# Altium footprint library self_pcblib v1.8.6.PcbLib: 123 footprints (part 2 of 8)
Each footprint in its own frame and in the unit in brackets; x right, y up, seen from the top. Pads: shape width x height; smd on the part's side, far side on the other; paste and mask are expansions set on the pad; w line width, h text height; cw(c..) or ccw(c..) is an arc to the next point about the centre after c.
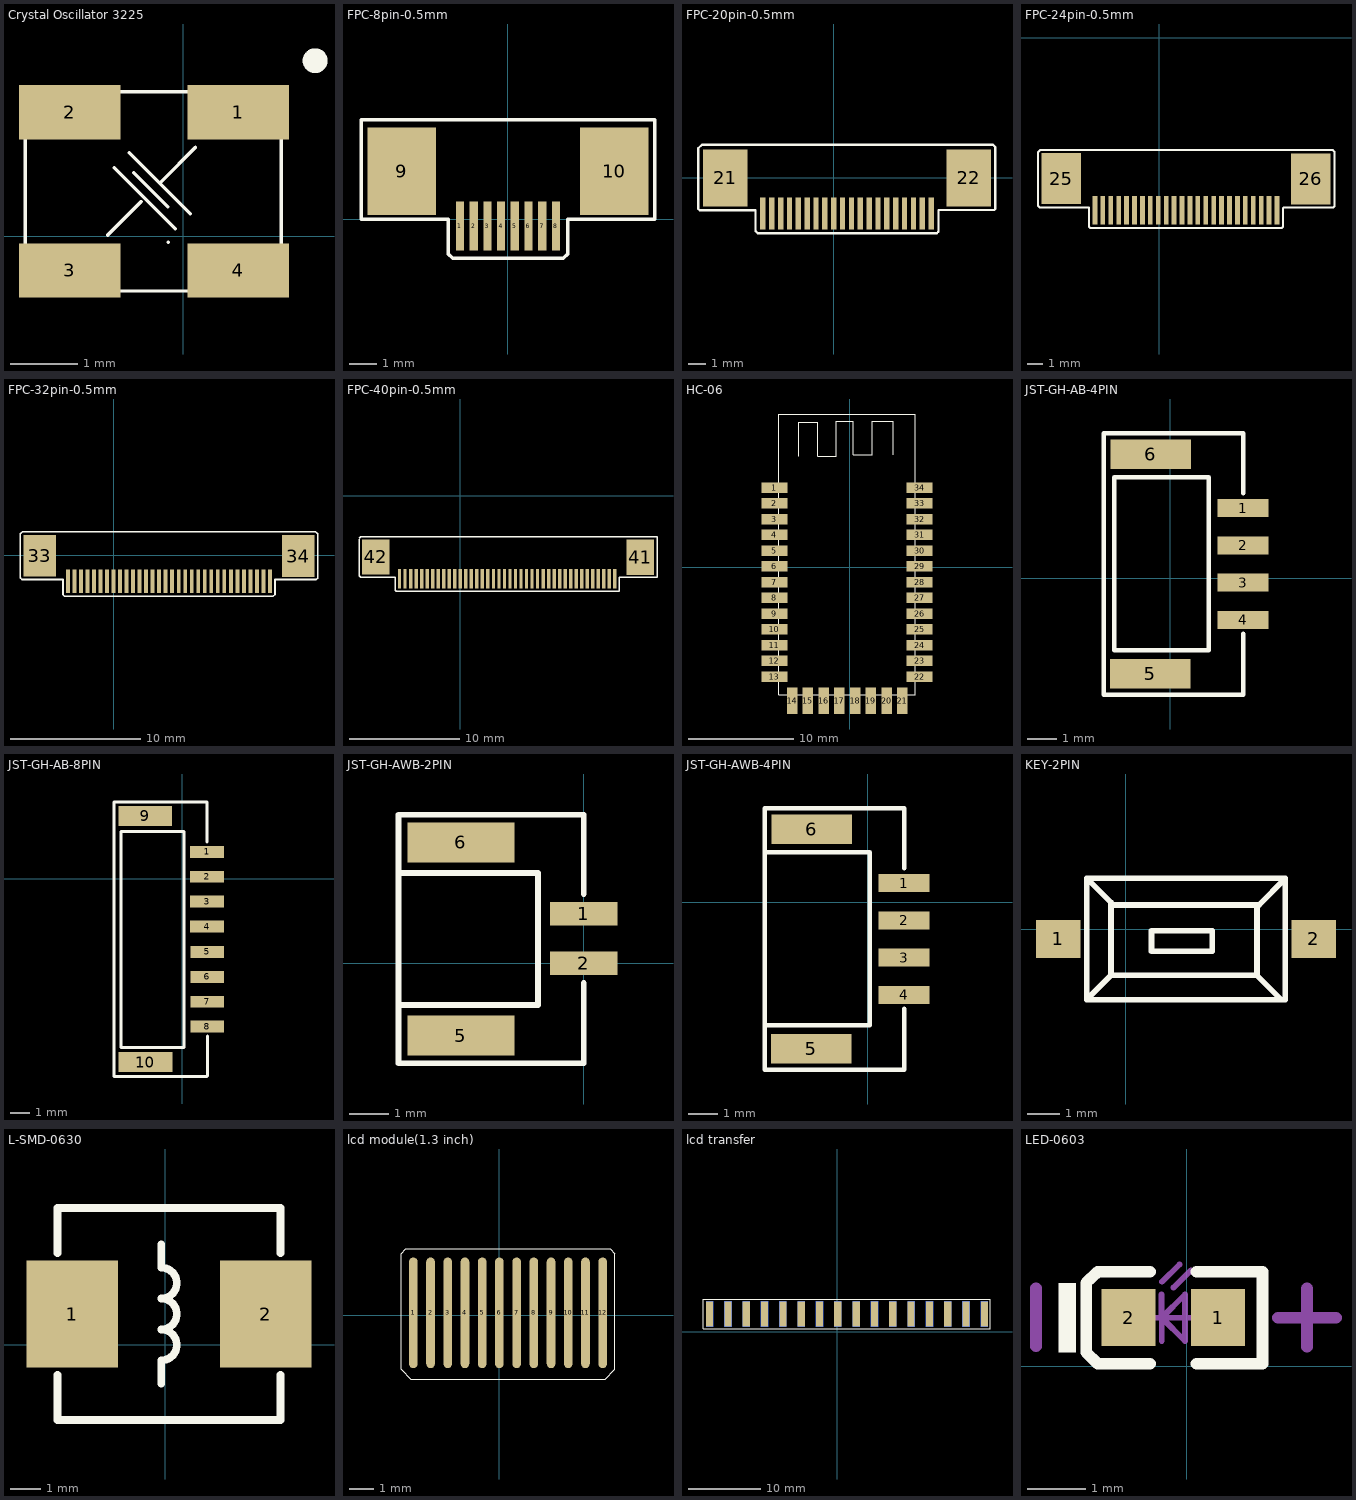
[diagram p1: the footprints below, top view; thin cyan lines are the x and y axes]

## Crystal Oscillator 3225 [mm]
pads (4):
  rect 1.5x0.8 smd: 1(0.813,1.829) 2(-1.676,1.829) 3(-1.676,-0.508) 4(0.813,-0.508)
Top Overlay:
  circle w0.254: c1.95,2.591 r0.057
  lines w0.051: -1.018,1.01 -0.118,0.11 ; -0.798,1.23 0.102,0.33 ; -0.729,0.932 -0.229,0.432 ; -0.618,0.51 -1.118,0.01 ; 0.182,1.31 -0.318,0.81 ; -1.118,0.01 -1.118,0.01 ; -0.318,0.81 -0.318,0.81 ; -2.334,-0.813 1.448,-0.813 1.448,2.134 -2.334,2.134 -2.334,-0.813 ; -0.218,-0.09 -0.218,-0.09
3D body "User Library-3225-1.STEP": height 0.61, standoff 0, extent -2.057,-0.59 1.143,1.91

## FPC-8pin-0.5mm [mm]
pads (10):
  rect 0.3x1.8 smd: 1(-1.739,-0.247) 2(-1.239,-0.247) 3(-0.739,-0.247) 4(-0.239,-0.247) 5(0.261,-0.247) 6(0.761,-0.247) 7(1.261,-0.247) 8(1.761,-0.247)
  rect 2.5x3.2 smd: 9(-3.861,1.753) 10(3.886,1.753)
Top Overlay:
  lines w0.127: -5.334,0 -5.334,3.632 5.359,3.632 5.359,0 2.184,0 2.184,-1.27 2.032,-1.422 -2.007,-1.422 -2.159,-1.27 -2.159,0 -5.334,0
3D body "1734839-8.stp": height 2.02, standoff -0.03, extent -4.715,-0.741 4.715,4.369

## FPC-20pin-0.5mm [mm]
pads (22):
  rect 0.3x1.8 smd: 1(-4,-2) 2(-3.5,-2) 3(-3,-2) 4(-2.5,-2) 5(-2,-2) 6(-1.5,-2) 7(-1,-2) 8(-0.5,-2) 9(0,-2) 10(0.5,-2) 11(1,-2) 12(1.5,-2) 13(2,-2) 14(2.5,-2) 15(3,-2) 16(3.5,-2) 17(4,-2) 18(4.5,-2) 19(5,-2) 20(5.5,-2)
  rect 2.5x3.2 smd: 21(-6.121,0) 22(7.62,0)
Top Overlay:
  lines w0.127: -7.645,-1.753 -7.645,1.676 -7.442,1.88 8.992,1.88 9.119,1.753 9.119,-1.753 9.068,-1.803 5.918,-1.803 5.918,-3.023 5.817,-3.124 -4.293,-3.124 -4.42,-2.997 -4.42,-1.829 -7.569,-1.829 -7.645,-1.753
3D body "2-1734839-0.stp": height 2.02, standoff -0.03, extent -6.978,-2.54 8.452,2.57

## FPC-24pin-0.5mm [mm]
pads (26):
  rect 0.3x1.8 smd: 1(-4.076,-10.89) 2(-3.576,-10.89) 3(-3.076,-10.89) 4(-2.576,-10.89) 5(-2.076,-10.89) 6(-1.576,-10.89) 7(-1.076,-10.89) 8(-0.576,-10.89) 9(-0.076,-10.89) 10(0.424,-10.89) 11(0.924,-10.89) 12(1.424,-10.89) 13(1.924,-10.89) 14(2.424,-10.89) 15(2.924,-10.89) 16(3.424,-10.89) 17(3.924,-10.89) 18(4.424,-10.89) 19(4.924,-10.89) 20(5.424,-10.89) 21(5.924,-10.89) 22(6.424,-10.89) 23(6.924,-10.89) 24(7.424,-10.89)
  rect 2.5x3.2 smd: 25(-6.198,-8.89) 26(9.55,-8.915)
Top Overlay:
  lines w0.127: -7.671,-10.617 -7.671,-7.239 -7.518,-7.087 10.947,-7.087 11.049,-7.188 11.049,-10.643 10.973,-10.719 7.849,-10.719 7.798,-10.77 7.798,-11.938 7.722,-12.014 -4.369,-12.014 -4.445,-11.938 -4.445,-10.719 -7.569,-10.719 -7.671,-10.617
3D body "2-1734592-4.stp": height 2.02, standoff -0.03, extent -7.039,-11.252 10.391,-6.142

## FPC-32pin-0.5mm [mm]
pads (34):
  rect 0.3x1.8 smd: 1(-3.5,-2) 2(-3,-2) 3(-2.5,-2) 4(-2,-2) 5(-1.5,-2) 6(-1,-2) 7(-0.5,-2) 8(0,-2) 9(0.5,-2) 10(1,-2) 11(1.5,-2) 12(2,-2) 13(2.5,-2) 14(3,-2) 15(3.5,-2) 16(4,-2) 17(4.5,-2) 18(5,-2) 19(5.5,-2) 20(6,-2) 21(6.5,-2) 22(7,-2) 23(7.5,-2) 24(8,-2) 25(8.5,-2) 26(9,-2) 27(9.5,-2) 28(10,-2) 29(10.5,-2) 30(11,-2) 31(11.5,-2) 32(12,-2)
  rect 2.5x3.2 smd: 33(-5.664,-0.025) 34(14.173,-0.051)
Top Overlay:
  lines w0.127: -7.163,1.6 -7.163,-1.727 -7.036,-1.854 -3.886,-1.854 -3.886,-3.023 -3.785,-3.124 12.268,-3.124 12.395,-2.997 12.395,-1.854 13.97,-1.854 15.57,-1.854 15.672,-1.753 15.672,1.651 15.519,1.803 -7.01,1.803 -7.163,1.651
3D body "70801.stp": height 2, standoff -0.05, extent -6.5,-2.3 15,3.3

## FPC-40pin-0.5mm [mm]
pads (42):
  rect 0.3x1.8 smd: 1(-5.5,-7.5) 2(-5,-7.5) 3(-4.5,-7.5) 4(-4,-7.5) 5(-3.5,-7.5) 6(-3,-7.5) 7(-2.5,-7.5) 8(-2,-7.5) 9(-1.5,-7.5) 10(-1,-7.5) 11(-0.5,-7.5) 12(0,-7.5) 13(0.5,-7.5) 14(1,-7.5) 15(1.5,-7.5) 16(2,-7.5) 17(2.5,-7.5) 18(3,-7.5) 19(3.5,-7.5) 20(4,-7.5) 21(4.5,-7.5) 22(5,-7.5) 23(5.5,-7.5) 24(6,-7.5) 25(6.5,-7.5) 26(7,-7.5) 27(7.5,-7.5) 28(8,-7.5) 29(8.5,-7.5) 30(9,-7.5) 31(9.5,-7.5) 32(10,-7.5) 33(10.5,-7.5) 34(11,-7.5) 35(11.5,-7.5) 36(12,-7.5) 37(12.5,-7.5) 38(13,-7.5) 39(13.5,-7.5) 40(14,-7.5)
  rect 2.5x3.2 smd: 41(16.307,-5.537) 42(-7.664,-5.525)
Top Overlay:
  lines w0.127: -9.163,-3.9 -9.163,-7.227 -9.036,-7.354 -5.886,-7.354 -5.886,-8.523 -5.785,-8.624 14.376,-8.624 14.376,-7.354 17.831,-7.354 17.831,-3.697 -9.01,-3.697 -9.163,-3.849
3D body "4-1734592-0.stp": height 2, standoff -0.05, extent -8.448,-8.001 16.982,-2.891

## HC-06 [mm]
pads (34):
  rect 2.5x1 smd: 1(-7.171,7.604) 2(-7.171,6.104) 3(-7.171,4.604) 4(-7.171,3.104) 5(-7.171,1.604) 6(-7.171,0.104) 7(-7.171,-1.396) 8(-7.171,-2.896) 9(-7.171,-4.396) 10(-7.171,-5.896) 11(-7.171,-7.396) 12(-7.171,-8.896) 13(-7.171,-10.396) 22(6.629,-10.396) 23(6.629,-8.896) 24(6.629,-7.396) 25(6.629,-5.896) 26(6.629,-4.396) 27(6.629,-2.896) 28(6.629,-1.396) 29(6.629,0.104) 30(6.629,1.604) 31(6.629,3.104) 32(6.629,4.604) 33(6.629,6.104) 34(6.629,7.604)
  rect 1x2.5 smd: 14(-5.496,-12.696) 15(-3.996,-12.696) 16(-2.496,-12.696) 17(-0.996,-12.696) 18(0.504,-12.696) 19(2.004,-12.696) 20(3.504,-12.696) 21(5.004,-12.696)
Top Overlay:
  lines w0.1: -4.871,10.604 -4.871,13.804 -3.071,13.804 -3.071,10.604 -1.271,10.604 -1.271,13.904 0.329,13.904 0.329,10.704 2.129,10.704 2.129,13.904 4.129,13.904 4.129,10.704 ; -6.771,-12.096 6.229,-12.096 6.229,14.604 -6.771,14.604 -6.771,-12.096
3D body "Bluetooth HC-06_.step": height 0, standoff -2.35, extent -7.271,-12.201 6.749,15.809

## JST-GH-AB-4PIN [mm] "立贴"
pads (6):
  rect 1.7x0.6 smd: 1(2.444,2.352) 2(2.444,1.102) 3(2.444,-0.148) 4(2.444,-1.398)
  rect 2.7x1 smd: 5(-0.66,-3.2) 6(-0.656,4.152)
Top Overlay:
  lines w0.15: 2.444,-1.854 2.444,-3.912 -2.231,-3.912 -2.231,4.852 2.444,4.852 2.444,2.852 ; -1.878,-2.413 1.294,-2.413 1.294,3.377 -1.878,3.377 -1.878,-2.413

## JST-GH-AB-8PIN [mm] "立贴"
pads (10):
  rect 1.7x0.6 smd: 1(1.237,1.348) 2(1.237,0.098) 3(1.237,-1.152) 4(1.237,-2.402) 5(1.249,-3.669) 6(1.249,-4.919) 7(1.249,-6.169) 8(1.249,-7.419)
  rect 2.7x1 smd: 9(-1.863,3.148) 10(-1.854,-9.195)
Top Overlay:
  lines w0.15: 1.237,-9.906 -3.438,-9.906 -3.438,3.848 1.237,3.848 1.237,1.848 ; 1.27,-9.887 1.27,-7.887 ; -3.085,-8.458 0.087,-8.458 0.087,2.373 -3.085,2.373 -3.085,-8.458

## JST-GH-AWB-2PIN [mm] "卧贴"
pads (4):
  rect 1.7x0.6 smd: 1(0,1.25) 2(0,0)
  rect 2.7x1 smd: 5(-3.1,-1.825) 6(-3.1,3.05)
Top Overlay:
  lines w0.15: -4.675,2.275 -1.15,2.275 -1.15,-1.05 -2.019,-1.05 -3.756,-1.05 -4.625,-1.05 ; 0,-0.5 0,-2.525 -4.675,-2.525 -4.675,3.75 0,3.75 0,1.75

## JST-GH-AWB-4PIN [mm] "卧贴"
pads (6):
  rect 1.7x0.6 smd: 1(1.225,0.65) 2(1.225,-0.6) 3(1.225,-1.85) 4(1.225,-3.1)
  rect 2.7x1 smd: 5(-1.88,-4.902) 6(-1.875,2.45)
Top Overlay:
  lines w0.15: -3.45,1.675 0.075,1.675 0.075,-4.115 -3.426,-4.115 ; 1.225,-3.556 1.225,-5.613 -3.45,-5.613 -3.45,3.15 1.225,3.15 1.225,1.15
3D body "User Library-SM04B-GHS-TB.STEP": height 4.25, standoff -0.1, extent -3.314,-5.359 1.536,2.891

## KEY-2PIN [mm]
pads (2):
  rect 1.4x1.2 smd: 1(-2.119,-0.305) 2(5.881,-0.305)
Top Overlay:
  lines w0.178: -0.468,0.838 -0.468,-1.443 ; 4.104,0.699 4.104,-1.448 ; 4.993,1.595 -1.23,1.595 ; -1.23,-2.205 -1.23,1.595 ; -1.23,-2.205 4.993,-2.205 ; -1.23,-2.205 -0.468,-1.443 ; -1.23,1.595 -1.225,1.595 -0.392,0.762 4.167,0.762 4.993,1.588 4.993,-2.205 ; -0.468,-1.443 4.099,-1.443 4.104,-1.448 ; 4.104,-1.448 4.861,-2.205 4.993,-2.205 ; 0.802,-0.686 0.802,-0.051 2.707,-0.051 2.707,-0.686 0.802,-0.686
3D body "按键.STEP": height 1.9, standoff 0, extent -1.42,-1.905 5.18,1.295

## L-SMD-0630 [mm] "电感"
pads (2):
  rect 3x3.5 smd: 1(-3.048,1.016) 2(3.302,1.016)
Top Overlay:
  lines w0.254: -3.531,-0.991 -3.531,-2.464 3.785,-2.464 3.785,-0.991 ; -3.531,3.023 -3.531,4.496 3.785,4.496 3.785,3.023 ; -0.127,-1.27 -0.127,-0.508 ccw(c-0.127,0) -0.127,0.508 ccw(c-0.127,1.016) -0.127,1.524 ccw(c-0.127,2.032) -0.127,2.54 -0.127,3.302
3D body "SMD-0630.STEP": height 3.05, standoff 0.02, extent -3.348,-2.284 3.602,4.316

## lcd module(1.3 inch) [mm]
pads (12):
  oval 0.35x4.5 smd: 1(-3.5,0.1) 2(-2.8,0.1) 3(-2.1,0.1) 4(-1.4,0.1) 5(-0.7,0.1) 6(0,0.1) 7(0.7,0.1) 8(1.4,0.1) 9(2.1,0.1) 10(2.8,0.1) 11(3.5,0.1) 12(4.2,0.1)
Top Overlay:
  lines w0.051: -4,-2.2 -4,2.5 -3.8,2.7 4.5,2.7 4.7,2.5 4.7,-2.2 4.3,-2.6 -3.6,-2.6 -4,-2.2

## lcd transfer [mm]
pads (32):
  rect 1x3.5 smd far side: 1(-17.729,2.489) 3(-15.189,2.489) 5(-12.649,2.489) 7(-10.109,2.489) 9(-7.569,2.489) 11(-5.029,2.489) 13(-2.489,2.489) 15(0.051,2.489) 17(2.591,2.489) 19(5.131,2.489) 21(7.671,2.489) 23(10.211,2.489) 25(12.751,2.489) 27(15.291,2.489) 29(17.831,2.489) 31(20.371,2.489)
  rect 1x3.5 smd: 2(-17.729,2.489) 4(-15.189,2.489) 6(-12.649,2.489) 8(-10.109,2.489) 10(-7.569,2.489) 12(-5.029,2.489) 14(-2.489,2.489) 16(0.051,2.489) 18(2.591,2.489) 20(5.131,2.489) 22(7.671,2.489) 24(10.211,2.489) 26(12.751,2.489) 28(15.291,2.489) 30(17.831,2.489) 32(20.371,2.489)
Top Overlay:
  lines w0.127: -18.593,0.432 21.184,0.432 21.184,4.547 -18.593,4.547 -18.593,0.432

## LED-0603 [mm]
pads (2):
  rect 0.93x0.98 smd: 1(0.541,0.838) 2(-0.999,0.838)
Top Overlay:
  rectangle: -2.204,0.238 -1.904,1.438
  lines w0.2: -0.629,0.048 -1.529,0.048 -1.729,0.241 -1.729,1.435 -1.529,1.628 -0.629,1.628 ; 0.171,0.048 1.306,0.048 1.306,1.628 0.171,1.628
Mechanical 13:
  lines w0.1: -0.629,0.838 0.171,0.838 ; -0.429,0.438 -0.429,1.238 ; -0.424,1.455 -0.124,1.755 ; -0.224,1.355 0.076,1.655 ; -0.429,0.838 -0.029,1.238 -0.029,0.438 -0.429,0.838
Mechanical 15:
  lines w0.203: -2.591,0.346 -2.591,1.346 ; 1.571,0.838 2.571,0.838 ; 2.071,0.338 2.071,1.338
3D body "User Library-LED_0603_R.STEP": height 0.6, standoff 0, extent -1.028,0.438 0.572,1.238